# Altium footprint library PcbLib1.PcbLib: 51 footprints (part 2 of 4)
Each footprint in its own frame and in the unit in brackets; x right, y up, seen from the top. Pads: shape width x height; smd on the part's side, far side on the other; paste and mask are expansions set on the pad; w line width, h text height; cw(c..) or ccw(c..) is an arc to the next point about the centre after c.
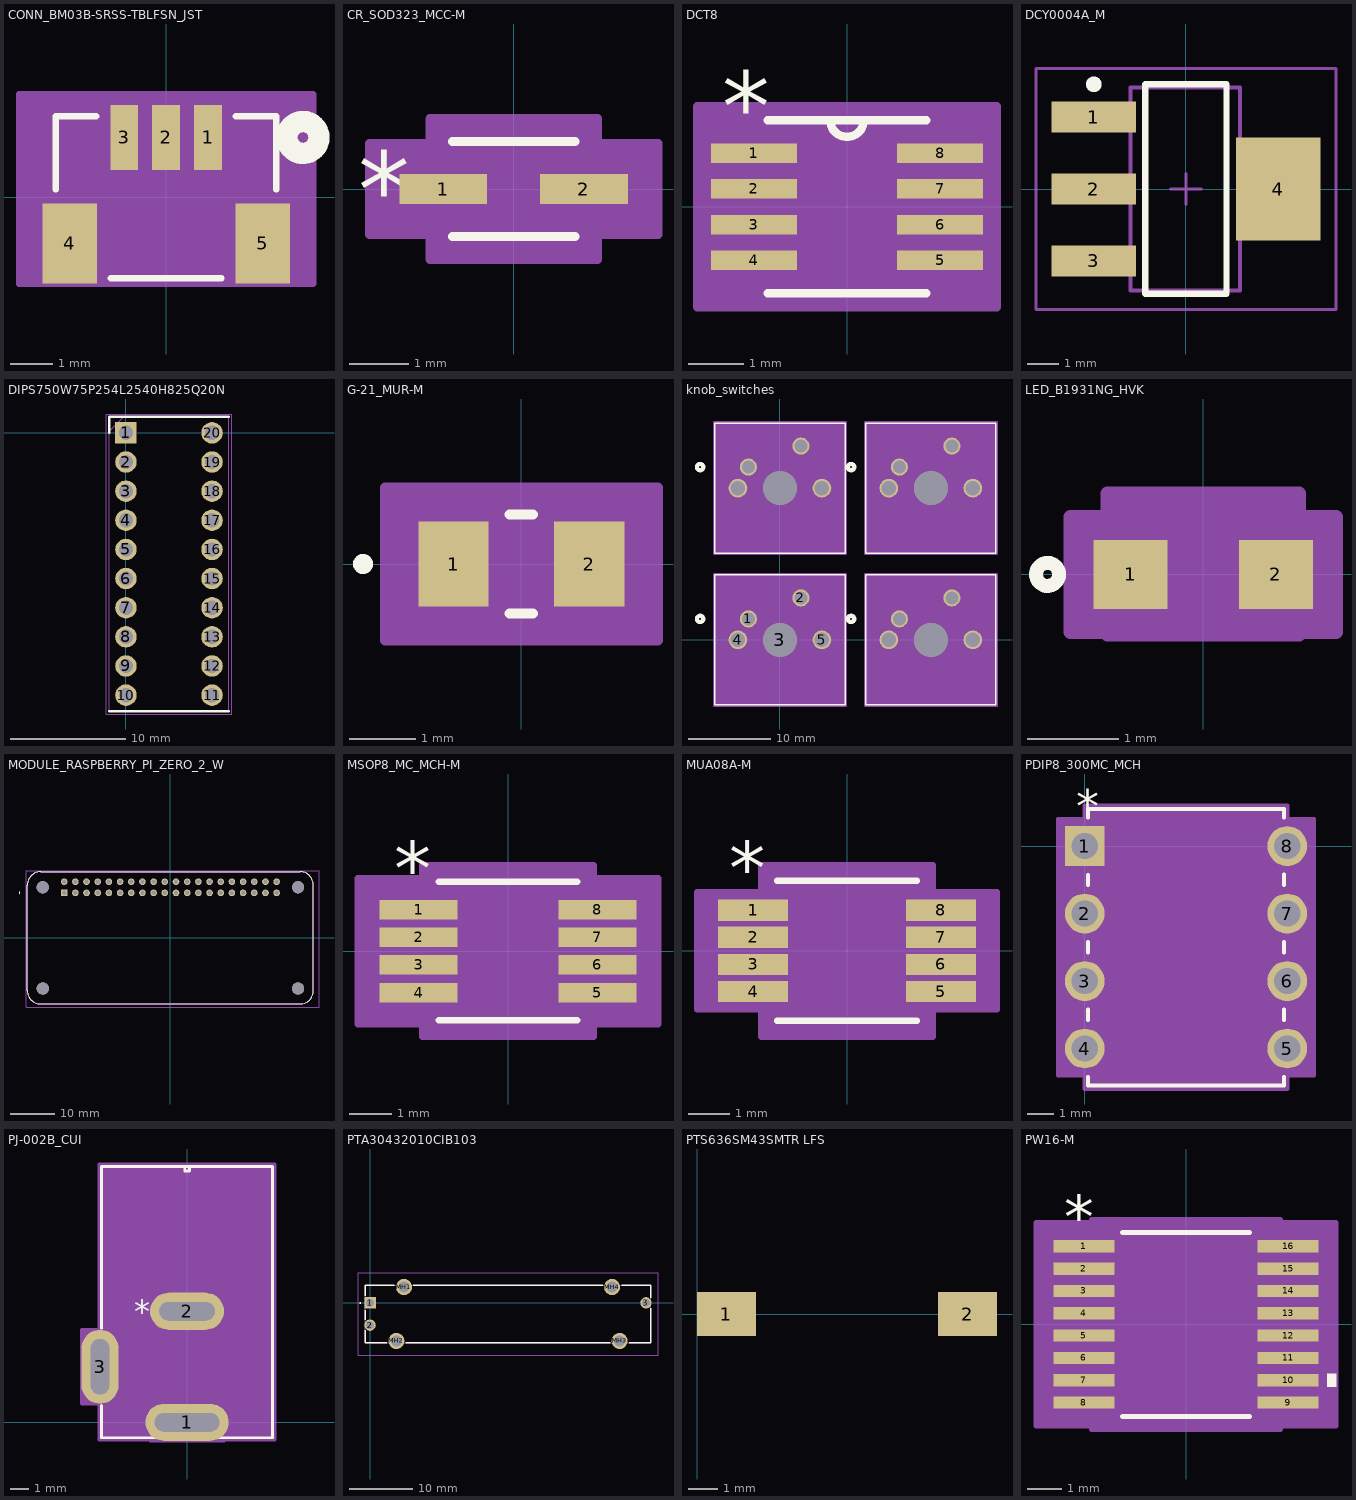
[diagram p1: the footprints below, top view; thin cyan lines are the x and y axes]

## CONN_BM03B-SRSS-TBLFSN_JST [mil]
pads (5):
  rect 26x61 smd paste+0 mask+0: 1(39.37,56.24) 2(0,56.24) 3(-39.37,56.24)
  rect 51x75 smd paste-37.5 mask-37.5: 4(-90.55,-43.17) 5(90.55,-43.17)
Top Overlay:
  circle w20: c128.5,56.24 r15
  lines w6: -103.5,7.43 -103.5,76 -65.47,76 ; -51.95,-76 51.95,-76 ; 65.47,76 103.5,76 103.5,7.43
Bottom Overlay:
  circle w20: c128.5,56.24 r15
Mechanical 13:
  circle w20: c39.37,-18.76 r15
  lines w1: -98.5,-71 -98.5,71 98.5,71 98.5,-71 -98.5,-71
Mechanical 15:
  region: 138.05,96.74 -138.05,96.74 -138.05,-81 138.05,-81
  lines w6: -138.05,-81 138.05,-81 138.05,96.74 -138.05,96.74 -138.05,-81
3D body "BM03B-SRSS-TB.STEP": height 167.32, standoff 0, extent -98.43,-70.56 98.43,71.17

## CR_SOD323_MCC-M [mil]
pads (2):
  rect 58x20 smd paste+0 mask+0: 1(-46.5,0) 2(46.5,0)
Top Overlay:
  lines w6: -40.5,-31.5 40.5,-31.5 ; -40.5,31.5 40.5,31.5
  text "*" at -103,-25 h50
Mechanical 13:
  lines w1: -35.5,-13.25 -22.25,-26.5 ; -35.5,13.25 -22.25,26.5 ; -53.5,-8 -35.5,-8 -35.5,8 -53.5,8 -53.5,-8 ; -35.5,-26.5 -35.5,26.5 35.5,26.5 35.5,-26.5 -35.5,-26.5 ; 35.5,-8 53.5,-8 53.5,8 35.5,8 35.5,-8
  text "*" at -38,-25 h50
Mechanical 15:
  region: -55.5,-30 -95.5,-30 -95.5,30 -55.5,30 -55.5,46.5 55.5,46.5 55.5,30 95.5,30 95.5,-30 55.5,-30 55.5,-46.5 -55.5,-46.5
  lines w6: -95.5,-30 -55.5,-30 -55.5,-46.5 55.5,-46.5 55.5,-30 95.5,-30 95.5,30 55.5,30 55.5,46.5 -55.5,46.5 -55.5,30 -95.5,30 -95.5,-30
3D body "CR_SOD323_MCC.step": height 45.12, standoff 0, extent -53.5,-26.5 53.5,26.5

## DCT8 [mil]
pads (8):
  rect 61.5x14 smd paste-30.75 mask-31: 1(-66.75,38.39) 2(-66.75,12.8) 3(-66.75,-12.8) 4(-66.75,-38.39) 5(66.75,-38.39) 6(66.75,-12.8) 7(66.75,12.8) 8(66.75,38.39)
Top Overlay:
  lines w6: -57,-62 57,-62 ; -57,62 57,62 ; -12,62 ccw(c0,62) 12,62
  text "*" at -89.25,47.39 h50
Mechanical 13:
  lines w0: -12,62 ccw(c0,62) 12,62
  lines w1: -83.5,-44.39 -57,-44.39 -57,-32.39 -83.5,-32.39 -83.5,-44.39 ; -83.5,-18.8 -57,-18.8 -57,-6.8 -83.5,-6.8 -83.5,-18.8 ; -83.5,6.8 -57,6.8 -57,18.8 -83.5,18.8 -83.5,6.8 ; -83.5,32.39 -57,32.39 -57,44.39 -83.5,44.39 -83.5,32.39 ; -57,-62 -57,62 57,62 57,-62 -57,-62 ; 57,-44.39 83.5,-44.39 83.5,-32.39 57,-32.39 57,-44.39 ; 57,-18.8 83.5,-18.8 83.5,-6.8 57,-6.8 57,-18.8 ; 57,6.8 83.5,6.8 83.5,18.8 57,18.8 57,6.8 ; 57,32.39 83.5,32.39 83.5,44.39 57,44.39 57,32.39
  text "*" at -89.25,47.39 h50
Mechanical 15:
  region: 107.5,-72 -107.5,-72 -107.5,72 107.5,72
  lines w6: -107.5,-72 107.5,-72 107.5,72 -107.5,72 -107.5,-72
3D body "DCT8.step": height 51.1, standoff 0, extent -83.5,-62.01 83.5,62.01

## DCY0004A_M [mm]
pads (4):
  rect 2.7x1 smd paste-0.102 mask+0.051: 1(-2.95,2.3) 2(-2.95,0) 3(-2.95,-2.3)
  rect 2.7x3.3 smd paste-0.102 mask+0.051: 4(2.95,0)
Top Overlay:
  circle w0.25: c-2.95,3.35 r0.125
  lines w0.2: -1.3,-3.35 1.3,-3.35 1.3,3.35 -1.3,3.35 -1.3,-3.35
Mechanical 13:
  lines w0.127: -3.525,-2.65 -3.525,-1.95 -2.797,-1.95 -2.612,-1.95 -2.374,-1.95 -2.003,-1.95 -1.775,-1.95 -1.775,-0.35 -2.003,-0.35 -2.374,-0.35 -2.612,-0.35 -2.797,-0.35 -3.525,-0.35 -3.525,0.35 -2.797,0.35 -2.612,0.35 -2.374,0.35 -2.003,0.35 -1.775,0.35 -1.775,1.95 -2.003,1.95 -2.374,1.95 -2.612,1.95 -2.797,1.95 -3.525,1.95 -3.525,2.65 -2.797,2.65 -2.612,2.65 -2.374,2.65 -2.003,2.65 -1.775,2.65 -1.775,3.25 1.725,3.25 1.725,1.5 1.953,1.5 2.324,1.5 2.562,1.5 2.747,1.5 3.475,1.5 3.475,-1.5 2.747,-1.5 2.562,-1.5 2.324,-1.5 1.953,-1.5 1.725,-1.5 1.725,-3.25 -1.775,-3.25 -1.775,-2.65 -2.003,-2.65 -2.374,-2.65 -2.612,-2.65 -2.797,-2.65 -3.525,-2.65
Mechanical 15:
  lines w0.1: -0.5,0 0.5,0 ; 0,-0.5 0,0.5 ; -4.8,-3.85 4.8,-3.85 4.8,3.85 -4.8,3.85 -4.8,-3.85
3D body "DCY0004A.stp": height 1.68, standoff 0, extent -3.5,-3.25 3.5,3.25

## DIPS750W75P254L2540H825Q20N [mm]
pads (20):
  rect 1.875x1.875 / inner round 1.875 / far side rect 1.875x1.875 hole 1.25: 1(0,0)
  round 1.875 hole 1.25: 2(0,-2.54) 3(0,-5.08) 4(0,-7.62) 5(0,-10.16) 6(0,-12.7) 7(0,-15.24) 8(0,-17.78) 9(0,-20.32) 10(0,-22.86) 11(7.5,-22.86) 12(7.5,-20.32) 13(7.5,-17.78) 14(7.5,-15.24) 15(7.5,-12.7) 16(7.5,-10.16) 17(7.5,-7.62) 18(7.5,-5.08) 19(7.5,-2.54) 20(7.5,0)
Top Overlay:
  lines w0.2: -1.455,-24.255 8.955,-24.255 ; -1.455,0 -1.455,1.395 8.955,1.395
Mechanical 15:
  lines w0.1: -1.455,0.125 -0.185,1.395 ; -1.455,-24.255 8.955,-24.255 8.955,1.395 -1.455,1.395 -1.455,-24.255
Mechanical 20:
  lines w0.05: -1.705,-24.505 9.205,-24.505 9.205,1.645 -1.705,1.645 -1.705,-24.505
3D body "XGxx10 v1.step": height 8, standoff -4, extent -1.397,-24.13 8.763,1.27

## G-21_MUR-M [mil]
pads (2):
  rect 42x51 smd paste+0 mask+0: 1(-40.5,0) 2(40.5,0)
Top Overlay:
  circle w6: c-94.5,0 r3
  lines w6: -7.03,-29.5 7.03,-29.5 ; -7.03,29.5 7.03,29.5
Mechanical 13:
  circle w0: c-35.5,0 r3
  lines w1: -39.5,-24.5 -39.5,24.5 ; -39.5,-24.5 39.5,-24.5 ; -39.5,-24.5 -19.5,-24.5 -19.5,24.5 -39.5,24.5 ; -39.5,-24.5 -39.5,24.5 ; -39.5,24.5 39.5,24.5 ; 39.5,-24.5 39.5,24.5 ; 39.5,-24.5 39.5,24.5 ; 39.5,-24.5 19.5,-24.5 19.5,24.5 39.5,24.5
Mechanical 15:
  region: 81.5,-45.5 -81.5,-45.5 -81.5,45.5 81.5,45.5
  lines w6: -81.5,-45.5 81.5,-45.5 81.5,45.5 -81.5,45.5 -81.5,-45.5
3D body "G-21_MUR.step": height 57.01, standoff 0, extent -39.49,-24.49 39.49,24.49

## knob_switches [mil]
pads (20):
  round 81 / inner round 60 / far side round 81 hole 61 paste-99999 mask+0: 1(-150,100) 2(100,200) ""(-150,823) ""(100,923) ""(569,100) ""(569,823) ""(819,200) ""(819,923)
  round 161 / inner round 60 / far side round 161 hole 161 unplated paste-99999 mask-80.5: 3(0,0) ""(0,723) ""(719,0) ""(719,723)
  round 89 / inner round 60 / far side round 89 hole 69 paste-99999 mask-44.5: 4(-200,0) 5(200,0) ""(-200,723) ""(200,723) ""(519,0) ""(519,723) ""(919,0) ""(919,723)
Top Overlay:
  circle w20: c-380,823 r15
  circle w20: c339,823 r15
  circle w20: c339,100 r15
  circle w20: c-380,100 r15
  lines w6: -310,-310 -310,310 310,310 310,-310 -310,-310 ; -310,413 -310,1033 310,1033 310,413 -310,413 ; 409,-310 409,310 1029,310 1029,-310 409,-310 ; 409,413 409,1033 1029,1033 1029,413 409,413
Bottom Overlay:
  circle w20: c-380,823 r15
  circle w20: c339,823 r15
  circle w20: c339,100 r15
  circle w20: c-380,100 r15
Mechanical 13:
  circle w20: c-150,898 r15
  circle w20: c569,898 r15
  circle w20: c569,175 r15
  circle w20: c-150,175 r15
  lines w1: -305,-305 -305,305 305,305 305,-305 -305,-305 ; -305,418 -305,1028 305,1028 305,418 -305,418 ; 414,-305 414,305 1024,305 1024,-305 414,-305 ; 414,418 414,1028 1024,1028 1024,418 414,418
Mechanical 15:
  region: 315,1038 -315,1038 -315,408 315,408
  region: 1034,1038 404,1038 404,408 1034,408
  region: 1034,315 404,315 404,-315 1034,-315
  region: 315,315 -315,315 -315,-315 315,-315
  lines w6: -315,-315 315,-315 315,315 -315,315 -315,-315 ; -315,408 315,408 315,1038 -315,1038 -315,408 ; 404,-315 1034,-315 1034,315 404,315 404,-315 ; 404,408 1034,408 1034,1038 404,1038 404,408
3D body "Kailh Polia.step": height 603.54, standoff -126.7, extent -274.61,415.01 274.61,1029.18
3D body "Kailh Polia.step": height 603.54, standoff -126.7, extent 444.39,415.01 993.61,1029.18
3D body "Kailh Polia.step": height 603.54, standoff -126.7, extent 444.39,-307.99 993.61,306.18
3D body "Kailh Polia.step": height 603.54, standoff -126.7, extent -274.61,-307.99 274.61,306.18

## LED_B1931NG_HVK [mil]
pads (2):
  rect 32x30 smd paste+0 mask+0: 1(-31.5,0) 2(31.5,0)
Top Overlay:
  circle w6: c-67.5,0 r5
Mechanical 13:
  circle w0: c-15.5,0 r3
  lines w0: -12,16 ccw(c0,16) 12,16
  lines w1: -31.5,-16 -31.5,16 31.5,16 31.5,-16 -31.5,-16
Mechanical 15:
  region: -41.5,-25 -57.5,-25 -57.5,25 -41.5,25 -41.5,35 41.5,35 41.5,25 57.5,25 57.5,-25 41.5,-25 41.5,-26 -41.5,-26
  lines w6: -57.5,-25 -41.5,-25 -41.5,-26 41.5,-26 41.5,-25 57.5,-25 57.5,25 41.5,25 41.5,35 -41.5,35 -41.5,25 -57.5,25 -57.5,-25
3D body "LED_B1931NG_HVK.step": height 16.1, standoff 0, extent -31.5,-15.98 31.5,15.98

## MODULE_RASPBERRY_PI_ZERO_2_W [mm]
pads (44):
  rect 1.508x1.508 / inner round 1.508 / far side rect 1.508x1.508 hole 1: 1(-24.13,10.23)
  round 1.508 hole 1: 2(-24.13,12.77) 3(-21.59,10.23) 4(-21.59,12.77) 5(-19.05,10.23) 6(-19.05,12.77) 7(-16.51,10.23) 8(-16.51,12.77) 9(-13.97,10.23) 10(-13.97,12.77) 11(-11.43,10.23) 12(-11.43,12.77) 13(-8.89,10.23) 14(-8.89,12.77) 15(-6.35,10.23) 16(-6.35,12.77) 17(-3.81,10.23) 18(-3.81,12.77) 19(-1.27,10.23) 20(-1.27,12.77) 21(1.27,10.23) 22(1.27,12.77) 23(3.81,10.23) 24(3.81,12.77) 25(6.35,10.23) 26(6.35,12.77) 27(8.89,10.23) 28(8.89,12.77) 29(11.43,10.23) 30(11.43,12.77) 31(13.97,10.23) 32(13.97,12.77) 33(16.51,10.23) 34(16.51,12.77) 35(19.05,10.23) 36(19.05,12.77) 37(21.59,10.23) 38(21.59,12.77) 39(24.13,10.23) 40(24.13,12.77)
  round 2.75 hole 2.75 unplated: ""(-29,-11.5) ""(-29,11.5) ""(29,-11.5) ""(29,11.5)
Top Overlay:
  circle w0.2: c-34.29,10.23 r0.1
  lines w0.127: 4.4,-15 12.75,-15 ; 17,-15 25.35,-15 ; -32.5,-12 ccw(c-29.5,-12) -29.5,-15 29.5,-15 ccw(c29.5,-12) 32.5,-12 32.5,12 ccw(c29.5,12) 29.5,15 -29.5,15 ccw(c-29.5,12) -32.5,12 -32.5,-12
Mechanical 13:
  circle w0.2: c-34.29,10.23 r0.1
  lines w0.127: 4.4,-15 12.75,-15 ; 17,-15 25.35,-15 ; -32.5,-12 ccw(c-29.5,-12) -29.5,-15 29.5,-15 ccw(c29.5,-12) 32.5,-12 32.5,12 ccw(c29.5,12) 29.5,15 -29.5,15 ccw(c-29.5,12) -32.5,12 -32.5,-12
Mechanical 15:
  lines w0.05: -32.75,-15.75 33.75,-15.75 33.75,15.25 -32.75,15.25 -32.75,-15.75

## MSOP8_MC_MCH-M [mil]
pads (8):
  rect 72x18 smd paste+0 mask+0: 1(-82.46,38.39) 2(-82.46,12.8) 3(-82.46,-12.8) 4(-82.46,-38.39) 5(82.46,-38.39) 6(82.46,-12.8) 7(82.46,12.8) 8(82.46,38.39)
Top Overlay:
  lines w6: -64.06,-64.06 64.06,-64.06 ; -64.06,64.06 64.06,64.06
  text "*" at -104.96,51.39 h50
Mechanical 13:
  lines w0: -12,59.06 ccw(c0,59.06) 12,59.06
  lines w1: -96.46,-46.39 -59.06,-46.39 -59.06,-30.39 -96.46,-30.39 -96.46,-46.39 ; -96.46,-20.8 -59.06,-20.8 -59.06,-4.8 -96.46,-4.8 -96.46,-20.8 ; -96.46,4.8 -59.06,4.8 -59.06,20.8 -96.46,20.8 -96.46,4.8 ; -96.46,30.39 -59.06,30.39 -59.06,46.39 -96.46,46.39 -96.46,30.39 ; -59.06,-59.06 -59.06,59.06 59.06,59.06 59.06,-59.06 -59.06,-59.06 ; 59.06,-46.39 96.46,-46.39 96.46,-30.39 59.06,-30.39 59.06,-46.39 ; 59.06,-20.8 96.46,-20.8 96.46,-4.8 59.06,-4.8 59.06,-20.8 ; 59.06,4.8 96.46,4.8 96.46,20.8 59.06,20.8 59.06,4.8 ; 59.06,30.39 96.46,30.39 96.46,46.39 59.06,46.39 59.06,30.39
  text "*" at -56.56,6.06 h50
Mechanical 15:
  region: -79.06,-67.39 -138.46,-67.39 -138.46,67.39 -79.06,67.39 -79.06,79.06 79.06,79.06 79.06,67.39 138.46,67.39 138.46,-67.39 79.06,-67.39 79.06,-79.06 -79.06,-79.06
  lines w6: -138.46,-67.39 -79.06,-67.39 -79.06,-79.06 79.06,-79.06 79.06,-67.39 138.46,-67.39 138.46,67.39 79.06,67.39 79.06,79.06 -79.06,79.06 -79.06,67.39 -138.46,67.39 -138.46,-67.39
3D body "MSOP8_MC_MCH.step": height 43.43, standoff 0, extent -96.46,-59.06 96.46,59.06

## MUA08A-M [mil]
pads (8):
  rect 66x20 smd paste-33 mask-33: 1(-88.5,38.39) 2(-88.5,12.8) 3(-88.5,-12.8) 4(-88.5,-38.39) 5(88.5,-38.39) 6(88.5,-12.8) 7(88.5,12.8) 8(88.5,38.39)
Top Overlay:
  lines w6: -66,-66 66,-66 ; -66,66 66,66
  text "*" at -111,53.39 h50
Mechanical 13:
  lines w0: -12,61 ccw(c0,61) 12,61
  lines w1: -99.5,-46.39 -99.5,-30.39 -61,-30.39 -61,-46.39 -99.5,-46.39 ; -99.5,-20.8 -99.5,-4.8 -61,-4.8 -61,-20.8 -99.5,-20.8 ; -99.5,4.8 -99.5,20.8 -61,20.8 -61,4.8 -99.5,4.8 ; -99.5,30.39 -99.5,46.39 -61,46.39 -61,30.39 -99.5,30.39 ; -61,-61 -61,61 61,61 61,-61 -61,-61 ; 61,-46.39 61,-30.39 99.5,-30.39 99.5,-46.39 61,-46.39 ; 61,-20.8 61,-4.8 99.5,-4.8 99.5,-20.8 61,-20.8 ; 61,4.8 61,20.8 99.5,20.8 99.5,4.8 61,4.8 ; 61,30.39 61,46.39 99.5,46.39 99.5,30.39 61,30.39
  text "*" at -63.5,28.39 h50
Mechanical 15:
  region: -81,-55.18 -141.5,-55.18 -141.5,55.18 -81,55.18 -81,81 81,81 81,55.18 141.5,55.18 141.5,-55.18 81,-55.18 81,-81 -81,-81
  lines w6: -141.5,-55.18 -141.5,55.18 -81,55.18 -81,81 81,81 81,55.18 141.5,55.18 141.5,-55.18 81,-55.18 81,-81 -81,-81 -81,-55.18 -141.5,-55.18
3D body "DGK0008A.stp": height 43.31, standoff 0, extent -96.5,-59 96.5,59

## PDIP8_300MC_MCH [mil]
pads (8):
  rect 59x59 / inner round 60 / far side rect 59x59 hole 39 paste-99999 mask+0: 1(0,0)
  round 59 / inner round 60 / far side round 59 hole 39 paste-99999 mask+0: 2(0,-100) 3(0,-200) 4(0,-300) 5(300,-300) 6(300,-200) 7(300,-100) 8(300,0)
Top Overlay:
  lines w6: 5,-342.31 5,-355 295,-355 295,-342.31 ; 5,-257.69 5,-242.31 ; 5,-157.69 5,-142.31 ; 5,-57.69 5,-42.6 ; 5,42.6 5,55 295,55 295,42.31 ; 295,-257.69 295,-242.31 ; 295,-157.69 295,-142.31 ; 295,-57.69 295,-42.31
  text "*" at -12.5,34.5 h50
Mechanical 13:
  lines w1: -19.5,-319.5 10,-319.5 10,-280.5 -19.5,-280.5 -19.5,-319.5 ; -19.5,-219.5 10,-219.5 10,-180.5 -19.5,-180.5 -19.5,-219.5 ; -19.5,-119.5 10,-119.5 10,-80.5 -19.5,-80.5 -19.5,-119.5 ; -19.5,-19.5 10,-19.5 10,19.5 -19.5,19.5 -19.5,-19.5 ; 10,-350 10,50 290,50 290,-350 10,-350 ; 290,-319.5 319.5,-319.5 319.5,-280.5 290,-280.5 290,-319.5 ; 290,-219.5 319.5,-219.5 319.5,-180.5 290,-180.5 290,-219.5 ; 290,-119.5 319.5,-119.5 319.5,-80.5 290,-80.5 290,-119.5 ; 290,-19.5 319.5,-19.5 319.5,19.5 290,19.5 290,-19.5
  text "*" at 7.5,-25 h50
Mechanical 15:
  region: 300,-340 339.5,-340 339.5,40 300,40 300,60 0,60 0,40 -39.5,40 -39.5,-340 0,-340 0,-360 300,-360
  lines w6: -39.5,-340 0,-340 0,-360 300,-360 300,-340 339.5,-340 339.5,40 300,40 300,60 0,60 0,40 -39.5,40 -39.5,-340
3D body "PDIP8_300MC_MCH.step": height 215.12, standoff -100, extent -5,-350 315,50

## PJ-002B_CUI [mm]
pads (3):
  oval 4.5x2 hole 1 slot 3.5 at 0 deg paste-2539.97 mask+0: 1(0,0)
  oval 4x2 hole 1 slot 3 at 0 deg paste-2539.97 mask+0: 2(0,6)
  oval 2x4 hole 1 slot 3 at 90 deg paste-2539.97 mask+0: 3(-4.7,3)
Top Overlay:
  lines w0.152: -4.623,0.917 -4.623,-0.829 -1.699,-0.829 ; -4.623,5.083 -4.623,13.827 4.623,13.827 4.623,-0.829 1.699,-0.829 ; -0.127,13.573 -0.127,13.827 0.127,13.827 0.127,13.573 -0.127,13.573
  text "*" at -2.857,5.365 h1.27
Mechanical 13:
  lines w0.025: -4.496,1.755 -4.902,1.755 -4.902,4.245 -4.496,4.245 ; -4.496,-0.702 -4.496,13.7 4.496,13.7 4.496,-0.702 -4.496,-0.702
  text "*" at -2.857,5.365 h1.27
Mechanical 15:
  region: -4.75,-0.956 -2.007,-0.956 -2.007,-1.003 2.007,-1.003 2.007,-0.956 4.75,-0.956 4.75,13.954 -4.75,13.954 -4.75,5.007 -5.703,5.007 -5.703,0.993 -4.75,0.993
  lines w0.152: -5.703,0.993 -4.75,0.993 -4.75,-0.956 -2.007,-0.956 -2.007,-1.003 2.007,-1.003 2.007,-0.956 4.75,-0.956 4.75,13.954 -4.75,13.954 -4.75,5.007 -5.703,5.007 -5.703,0.993
3D body "PJ-002B.step": height 11.01, standoff -3.49, extent -4.9,-0.7 4.5,13.7

## PTA30432010CIB103 [mm]
pads (7):
  rect 1.8x1.8 hole 1.2: 1(0,0)
  round 1.8 hole 1.2: 2(0,-3.5) 3(43.5,0)
  round 2.55 hole 1.7: MH1(5.35,2.5) MH2(4.15,-6) MH3(39.35,-6) MH4(38.15,2.5)
Top Overlay:
  lines w0.1: -1.6,0 cw(c-1.55,0) -1.5,0 cw(c-1.55,0) -1.6,0
  lines w0.2: -0.75,-4.35 -0.75,-6.25 2.65,-6.25 ; -0.75,-2.65 -0.75,-1.15 ; -0.75,1.15 -0.75,2.75 3.85,2.75 ; 5.65,-6.25 37.85,-6.25 ; 6.85,2.75 36.65,2.75 ; 39.65,2.75 44.25,2.75 44.25,0.85 ; 40.85,-6.25 44.25,-6.25 44.25,-0.85
Mechanical 15:
  lines w0.1: -0.75,-6.25 -0.75,2.75 44.25,2.75 44.25,-6.25 -0.75,-6.25
Mechanical 20:
  lines w0.1: -1.9,-8.275 -1.9,4.775 45.4,4.775 45.4,-8.275 -1.9,-8.275
3D body "PTA3043-2010CIB103.stp": height 17, standoff -3.2, extent -0.762,-6.478 44.438,2.922

## PTS636SM43SMTR LFS [mm] "SWITCH TACTILE SPST-NO 0.05A 12V"
pads (2):
  rect 2x1.5 smd: 1(1,0) 2(9.2,0)
3D body "PTS636SM43SMTRLFS.stp": height 4.3, standoff -0.03, extent 0.8,-1.75 9.4,1.75

## PW16-M [mil]
pads (16):
  rect 70x14 smd paste+0 mask+0: 1(-117,89.57) 2(-117,63.98) 3(-117,38.39) 4(-117,12.8) 5(-117,-12.8) 6(-117,-38.39) 7(-117,-63.98) 8(-117,-89.57) 9(117,-89.57) 10(117,-63.98) 11(117,-38.39) 12(117,-12.8) 13(117,12.8) 14(117,38.39) 15(117,63.98) 16(117,89.57)
Top Overlay:
  region: 162,-56.48 172,-56.48 172,-71.48 162,-71.48
  lines w6: -72.42,-105.5 72.42,-105.5 ; -72.42,105.5 72.42,105.5
  text "*" at -139.5,98.57 h50
Mechanical 13:
  lines w0: -12,100.5 ccw(c0,100.5) 12,100.5
  lines w1: -130,-95.57 -88.5,-95.57 -88.5,-83.57 -130,-83.57 -130,-95.57 ; -130,-69.98 -88.5,-69.98 -88.5,-57.98 -130,-57.98 -130,-69.98 ; -130,-44.39 -88.5,-44.39 -88.5,-32.39 -130,-32.39 -130,-44.39 ; -130,-18.8 -88.5,-18.8 -88.5,-6.8 -130,-6.8 -130,-18.8 ; -130,6.8 -88.5,6.8 -88.5,18.8 -130,18.8 -130,6.8 ; -130,32.39 -88.5,32.39 -88.5,44.39 -130,44.39 -130,32.39 ; -130,57.98 -88.5,57.98 -88.5,69.98 -130,69.98 -130,57.98 ; -130,83.57 -88.5,83.57 -88.5,95.57 -130,95.57 -130,83.57 ; -88.5,-100.5 -88.5,100.5 88.5,100.5 88.5,-100.5 -88.5,-100.5 ; 88.5,-95.57 130,-95.57 130,-83.57 88.5,-83.57 88.5,-95.57 ; 88.5,-69.98 130,-69.98 130,-57.98 88.5,-57.98 88.5,-69.98 ; 88.5,-44.39 130,-44.39 130,-32.39 88.5,-32.39 88.5,-44.39 ; 88.5,-18.8 130,-18.8 130,-6.8 88.5,-6.8 88.5,-18.8 ; 88.5,6.8 130,6.8 130,18.8 88.5,18.8 88.5,6.8 ; 88.5,32.39 130,32.39 130,44.39 88.5,44.39 88.5,32.39 ; 88.5,57.98 130,57.98 130,69.98 88.5,69.98 88.5,57.98 ; 88.5,83.57 130,83.57 130,95.57 88.5,95.57 88.5,83.57
  text "*" at -86,47.5 h50
Mechanical 15:
  region: -108.5,-116.57 -172,-116.57 -172,116.57 -108.5,116.57 -108.5,120.5 108.5,120.5 108.5,116.57 172,116.57 172,-116.57 108.5,-116.57 108.5,-120.5 -108.5,-120.5
  lines w6: -172,-116.57 -108.5,-116.57 -108.5,-120.5 108.5,-120.5 108.5,-116.57 172,-116.57 172,116.57 108.5,116.57 108.5,120.5 -108.5,120.5 -108.5,116.57 -172,116.57 -172,-116.57
3D body "PW16.step": height 47.09, standoff 0, extent -130,-100.51 130,100.51